# Altium integrated library Power IC.IntLib: 77 symbols
Pins are listed as number, name and electrical type; pins without a type are passive.

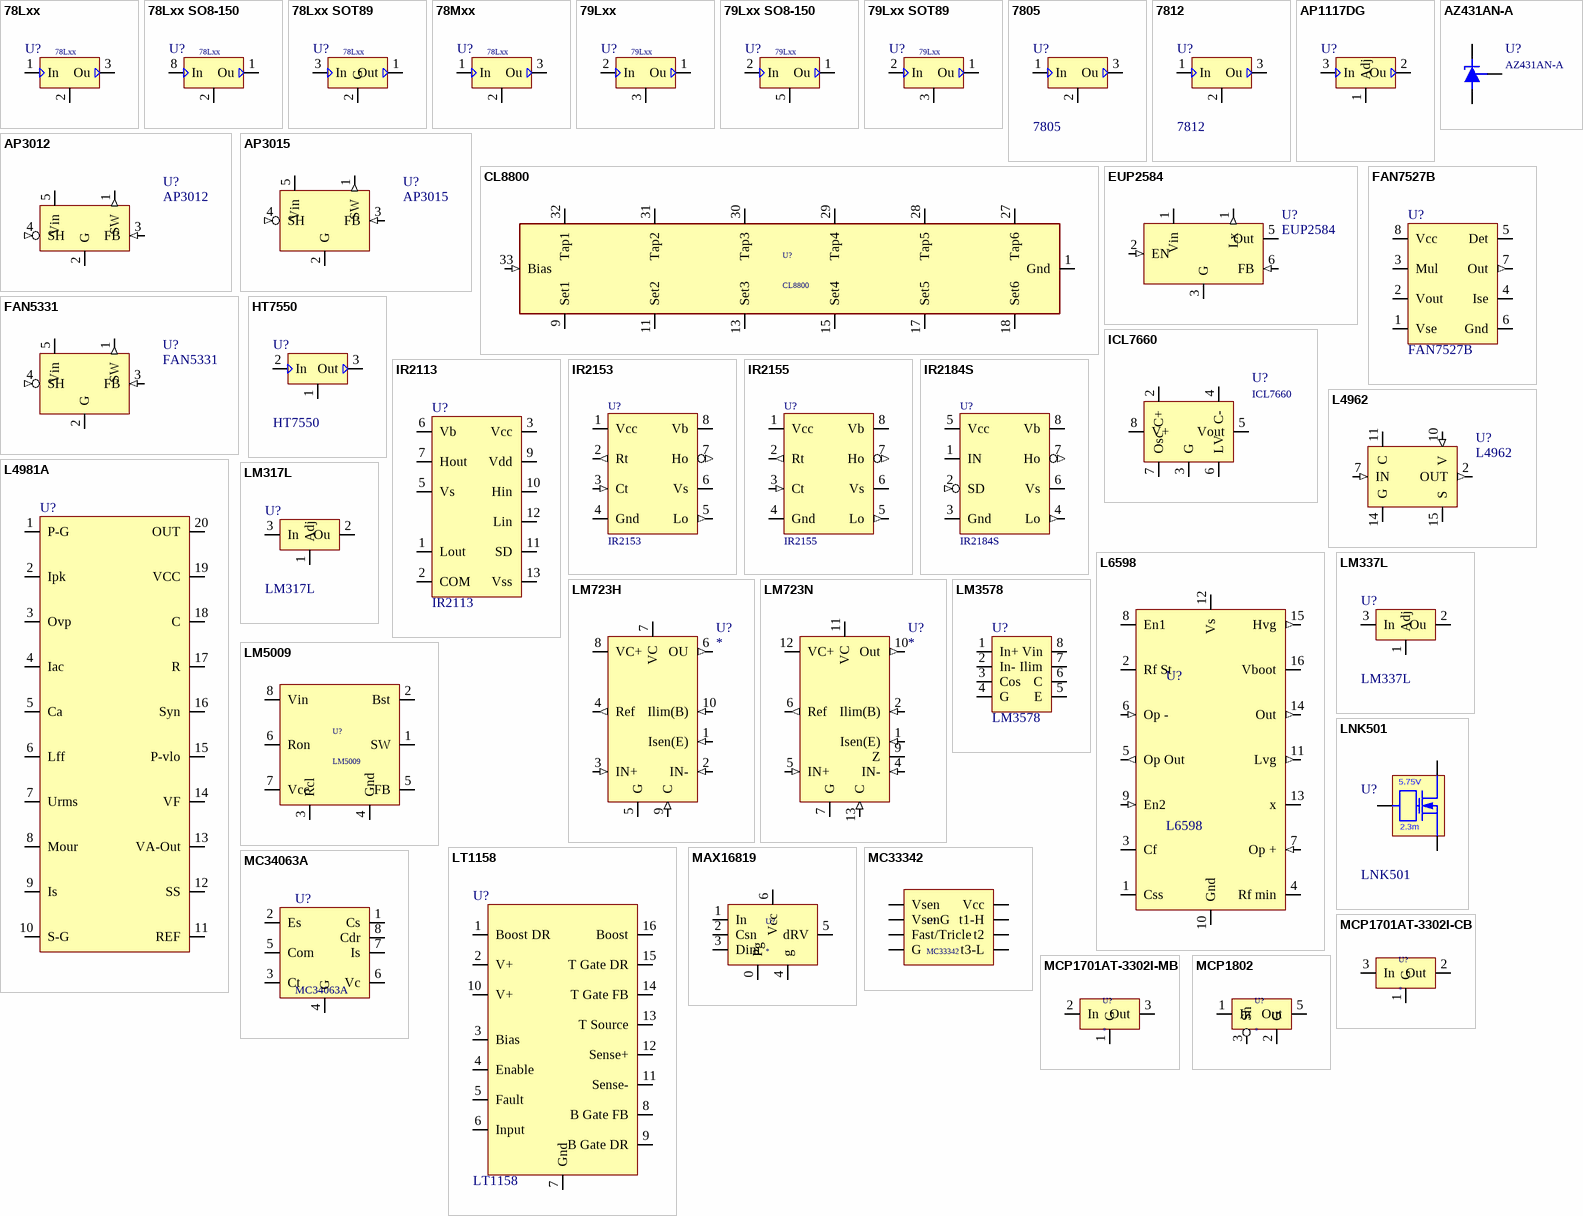
[diagram p0: symbols 78Lxx to MCP1802]

## 78Lxx
designator U?
0.1A d1.7V 3.6mA; Price: 0.184; Value: 78Lxx
footprint TO92C
footprint TO92A
footprint TO92
footprint TO92-1.27
pins: 1 In (power), 2 G (power), 3 Ou (power)

## 78Lxx SO8-150
designator U?, comment 78Lxx
0.1A d1.7V 3.6mA SO8-150; Price: 0.184; Value: 78Lxx
footprint SO8-150
pins: 1 Ou (power), 2 G (power), 3 G (power), 6 G (power), 7 G (power), 8 In (power)

## 78Lxx SOT89
designator U?, comment 78Lxx
0.1A d1.7V 3.6mA; Price: 0.184; Value: 78Lxx
footprint SOT89 (Footprint not found)
pins: 1 Out (power), 2 G (power), 3 In (power)

## 78Mxx
designator U?, comment 78Lxx
0.5A d1.7V 3.6mA; Price: 0.184; Value: 78Lxx
footprint TO220-1A 2.54
footprint TO220-2A 2.54
footprint TO220-2A 5.08
footprint TO220-1A 5.08
pins: 1 In (power), 2 G (power), 3 Ou (power)

## 79Lxx
designator U?
0.1A d1.7V 3.6mA; Price: 0.184; Value: 79Lxx
footprint TO92C
footprint TO92
footprint TO92A
footprint TO92-1.27
pins: 1 Ou (power), 2 In (power), 3 G (power)

## 79Lxx SO8-150
designator U?, comment 79Lxx
0.1A d1.7V 3.6mA SO8-150; Price: 0.184; Value: 79Lxx
footprint SO8-150
pins: 1 Ou (power), 2 In (power), 3 In (power), 5 G (power), 6 In (power), 7 In (power)

## 79Lxx SOT89
designator U?, comment 79Lxx
0.1A d1.7V 3.6mA; Price: 0.184; Value: 79Lxx
footprint SOT89 (SC-62)
pins: 1 Ou (power), 2 In (power), 3 G (power)

## 7805
designator U?
Price: 0.312
footprint TO220-1A 2.54
pins: 1 In (power), 2 G (power), 3 Ou (power)

## 7812
designator U?
Price: 0.312
footprint TO220-1A 2.54
pins: 1 In (power), 2 G (power), 3 Ou (power)

## AP1117DG
designator U?
1.25V  1A In-18V; Price: 0.11
footprint TO252AA
pins: 1 Adj, 2 Ou (power), 3 In (power)

## AP3012
designator U?
Vin-2.6-16V Vout-29V Fb-1.25V Imax-0.5A; Price: 0.82
footprint SOT23-5 (SOT23, 5-Leads, Body 2.9x1.3mm, Pitch 0.95mm, Lead Span 2.5mm)
pins: 1 SW (out), 2 G (power), 3 FB (in), 4 SH (in), 5 Vin (power)
1 alternate drawing of the same symbol

## AP3015
designator U?
Vin-1.2-12V Vout-38V Fb-1.23V Imax-0.35A; Price: 0.82
footprint SOT23-5 (SOT23, 5-Leads, Body 2.9x1.3mm, Pitch 0.95mm, Lead Span 2.5mm)
pins: 1 SW (out), 2 G (power), 3 FB (in), 4 SH (in), 5 Vin (power)
1 alternate drawing of the same symbol

## AZ431AN-A
designator U?
Price: 0.24
footprint SOT23
simulation model TL431A (subckt)
pins: 1 Adj, 2 K, 3 A

## CL8800
designator U?
footprint QFN-33
pins: 1 Gnd (power), 2 Gnd (power) hidden to Gnd, 3 Gnd (power) hidden to Gnd, 4 Gnd (power) hidden to Gnd, 5 Gnd (power) hidden to Gnd, 6 Gnd (power) hidden to Gnd, 7 Gnd (power) hidden to Gnd, 8 Gnd (power) hidden to Gnd, 9 Set1, 11 Set2, 13 Set3, 15 Set4, 17 Set5, 18 Set6, 19 Gnd (power) hidden to Gnd, 20 Gnd (power) hidden to Gnd, 21 Gnd (power) hidden to Gnd, 22 Gnd (power) hidden to Gnd, 23 Gnd (power) hidden to Gnd, 24 Gnd (power) hidden to Gnd, 25 Gnd (power) hidden to Gnd, 26 Gnd (power) hidden to Gnd, 27 Tap6 (oc), 28 Tap5 (oc), 29 Tap4 (oc), 30 Tap3 (oc), 31 Tap2 (oc), 32 Tap1 (oc), 33 Bias (in), 34 Gnd (power) hidden to Gnd

## EUP2584
designator U?
Led Driver  Vin 2.6-5.5V Vout 27V Fb-0.25V; Price: *
footprint SOT23-6 (SOT23, 6-Leads, Body 2.9x1.3mm, Pitch 0.95mm, Lead Span 2.5mm)
pins: 1 Lx (out), 1 Vin (power), 2 EN (in), 3 G (power), 5 Out, 6 FB (in)
1 alternate drawing of the same symbol

## FAN5331
designator U?
Led Driver  Vin-2.7-5.5V Vout-23V Fb-1.23V Imax-1A; Price: 0.82
footprint SOT23-5 (SOT23, 5-Leads, Body 2.9x1.3mm, Pitch 0.95mm, Lead Span 2.5mm)
pins: 1 SW (out), 2 G (power), 3 FB (in), 4 SH (in), 5 Vin (power)
1 alternate drawing of the same symbol

## FAN7527B
designator U?
Price: 1.08
footprint SO8-150
pins: 1 Vse, 2 Vout, 3 Mul, 4 Ise, 5 Det, 6 Gnd, 7 Out (out), 8 Vcc
1 alternate drawing of the same symbol

## HT7550
designator U?
In-24V Iss10uA dU0.1V; Price: 0.46
footprint SOT89 (SC-62)
pins: 1 G (power), 2 In (power), 3 Out (power)

## ICL7660
designator U?
Price: 1.26
footprint DIL8-300
pins: 2 C+, 3 G, 4 C-, 5 Vout, 6 LV, 7 Osc, 8 V+

## IR2113
designator U?
+2A/-2A 120&90nS 20nS; Price: 6.6
footprint DIL14-300
footprint SO14-150
pins: 1 Lout, 2 COM, 3 Vcc, 4 x hidden, 5 Vs, 6 Vb, 7 Hout, 8 (in) hidden to x, 9 Vdd, 10 Hin, 11 SD, 12 Lin, 13 Vss, 14 x (in) hidden

## IR2153
designator U?
Price: 1.5
footprint SO8-150
pins: 1 Vcc (power), 2 Rt (out), 3 Ct (in), 4 Gnd (power), 5 Lo (out), 6 Vs (power), 7 Ho (out), 8 Vb (power)

## IR2155
designator U?
Price: 4.452
footprint DIL8-300a
pins: 1 Vcc (power), 2 Rt (out), 3 Ct (in), 4 Gnd (power), 5 Lo (out), 6 Vs (power), 7 Ho (out), 8 Vb (power)

## IR2184S
designator U?
+1.4A/-1.8A 680&270nS 500nS; Price: 3.6
footprint SO8-150
pins: 1 IN, 2 SD (in), 3 Gnd (power), 4 Lo (out), 5 Vcc (power), 6 Vs, 7 Ho (out), 8 Vb

## L4962
designator U?
footprint DIL16-300a
pins: 2 OUT (out), 4 G (power) hidden to G, 5 G (power) hidden to GND, 7 IN (in), 10 V (in), 11 C (io), 12 G hidden to g, 13 G hidden to g, 14 G, 15 S

## L4981A
designator U?
Price: 10
footprint DIL20-300
pins: 1 P-G, 2 Ipk, 3 Ovp, 4 Iac, 5 Ca, 6 Lff, 7 Urms, 8 Mour, 9 Is, 10 S-G, 11 REF, 12 SS, 13 VA-Out, 14 VF, 15 P-vlo, 16 Syn, 17 R, 18 C, 19 VCC, 20 OUT

## L6598
designator U?
footprint DIL16-300a
pins: 1 Css, 2 Rf St, 3 Cf, 4 Rf min, 5 Op Out (out), 6 Op - (in), 7 Op + (in), 8 En1, 9 En2 (in), 10 Gnd (power), 11 Lvg (out), 12 Vs (power), 13 x, 14 Out (out), 15 Hvg (out), 16 Vboot

## LM317L
designator U?
1.25V  100mA In-40V; Price: 0.174
footprint TO92C
footprint TO92A
footprint TO92
footprint TO92-1.27
pins: 1 Adj, 2 Ou (power), 3 In (power)

## LM337L
designator U?
-1.25V  100mA In-40V; Price: 0.174
footprint TO92C
footprint TO92A
footprint TO92-1.27
footprint TO92
pins: 1 Adj, 2 Ou (power), 3 In (power)

## LM723H
designator U?
Price: 0.566
footprint TO10
pins: 1 Isen(E) (in), 2 IN- (in), 3 IN+ (in), 4 Ref (out), 5 G (power), 6 OU (out), 7 VC (power), 8 VC+ (power), 9 C (in), 10 Ilim(B) (in)

## LM723N
designator U?
Price: 0.566
footprint DIL14-300
pins: 1 Isen(E) (in), 2 Ilim(B) (in), 4 IN- (in), 5 IN+ (in), 6 Ref (out), 7 G (power), 9 Z, 10 Out (out), 11 VC (power), 12 VC+ (power), 13 C (in)

## LM3578
designator U?
footprint DIL8-300a
pins: 1 In+, 2 In-, 3 Cos, 4 G, 5 E, 6 C, 7 Ilim, 8 Vin

## LM5009
designator U?
Step-Down Vin 9.5-95V Iout 0.15A Fb 2.5V +/-2%; Price: 4.25
footprint VSOP8 (TSOP, 8-Leads, Body 3x3mm, Pitch 0.65mm, IPC High Density)
pins: 1 SW, 2 Bst, 3 Rcl, 4 Gnd, 5 FB, 6 Ron, 7 Vcc, 8 Vin

## LNK501
designator U?
42kHz 77% 254mA Contr 2.3mA-5.75V; Price: 1.52
footprint DIL8-300 LNK TNY26x
pins: 1 S, 2 S, 3 S, 4 S, 5 D, 7 S, 8 Con    
text: 5.75V; 2.3m

## LT1158
designator U?
Price: 8.2
footprint DIL16-300a
pins: 1 Boost DR (power), 2 V+, 3 Bias (power), 4 Enable (power), 5 Fault (power), 6 Input (power), 7 Gnd (power), 8 B Gate FB (power), 9 B Gate DR (power), 10 V+ (power), 11 Sense- (power), 12 Sense+ (power), 13 T Source (power), 14 T Gate FB (power), 15 T Gate DR (power), 16 Boost (power)

## MAX16819
designator U?
footprint TDFN-EP 6 (3x3x0.8 6Pin)
pins: 0 Pg, 1 In, 2 Csn, 3 Dim, 4 g, 5 dRV, 6 Vcc

## MC33342
designator U?
footprint SO8-150 (Footprint not found)
pins: 1 Vsen, 2 VsenG (oc), 3 Fast/Tricle (oc), 4 G (power), 5 t3-L, 6 t2, 7 t1-H, 8 Vcc (power)

## MC34063A
designator U?
Price: 0.54
footprint DIL8-300a
pins: 1 Cs, 2 Es, 3 Ct, 4 G, 5 Com, 6 Vc, 7 Is, 8 Cdr
3 alternate drawings of the same symbol

## MCP1701AT-3302I-CB
designator U?
3.3V /0.15A 12Vmax 0.7V/150mA 4.5uA; Price: 1.53
footprint SOT23-5
pins: 1 G, 2 Out, 3 In, 4 NC hidden to x

## MCP1701AT-3302I-MB
designator U?
3.3V /0.15A 12Vmax 0.7V/150mA 4.5uA; Price: 1.53
footprint SOT89 (SC-62)
pins: 1 G, 2 In, 3 Out, 4 NC hidden to x

## MCP1802
designator U?
5V /0.A 10Vmax 0.2V/100mA 25uA/0.01uA Sh; Price: 1.53
footprint SOT23-5
pins: 1 In, 2 G, 3 Sh, 4 NC hidden to x, 5 Out

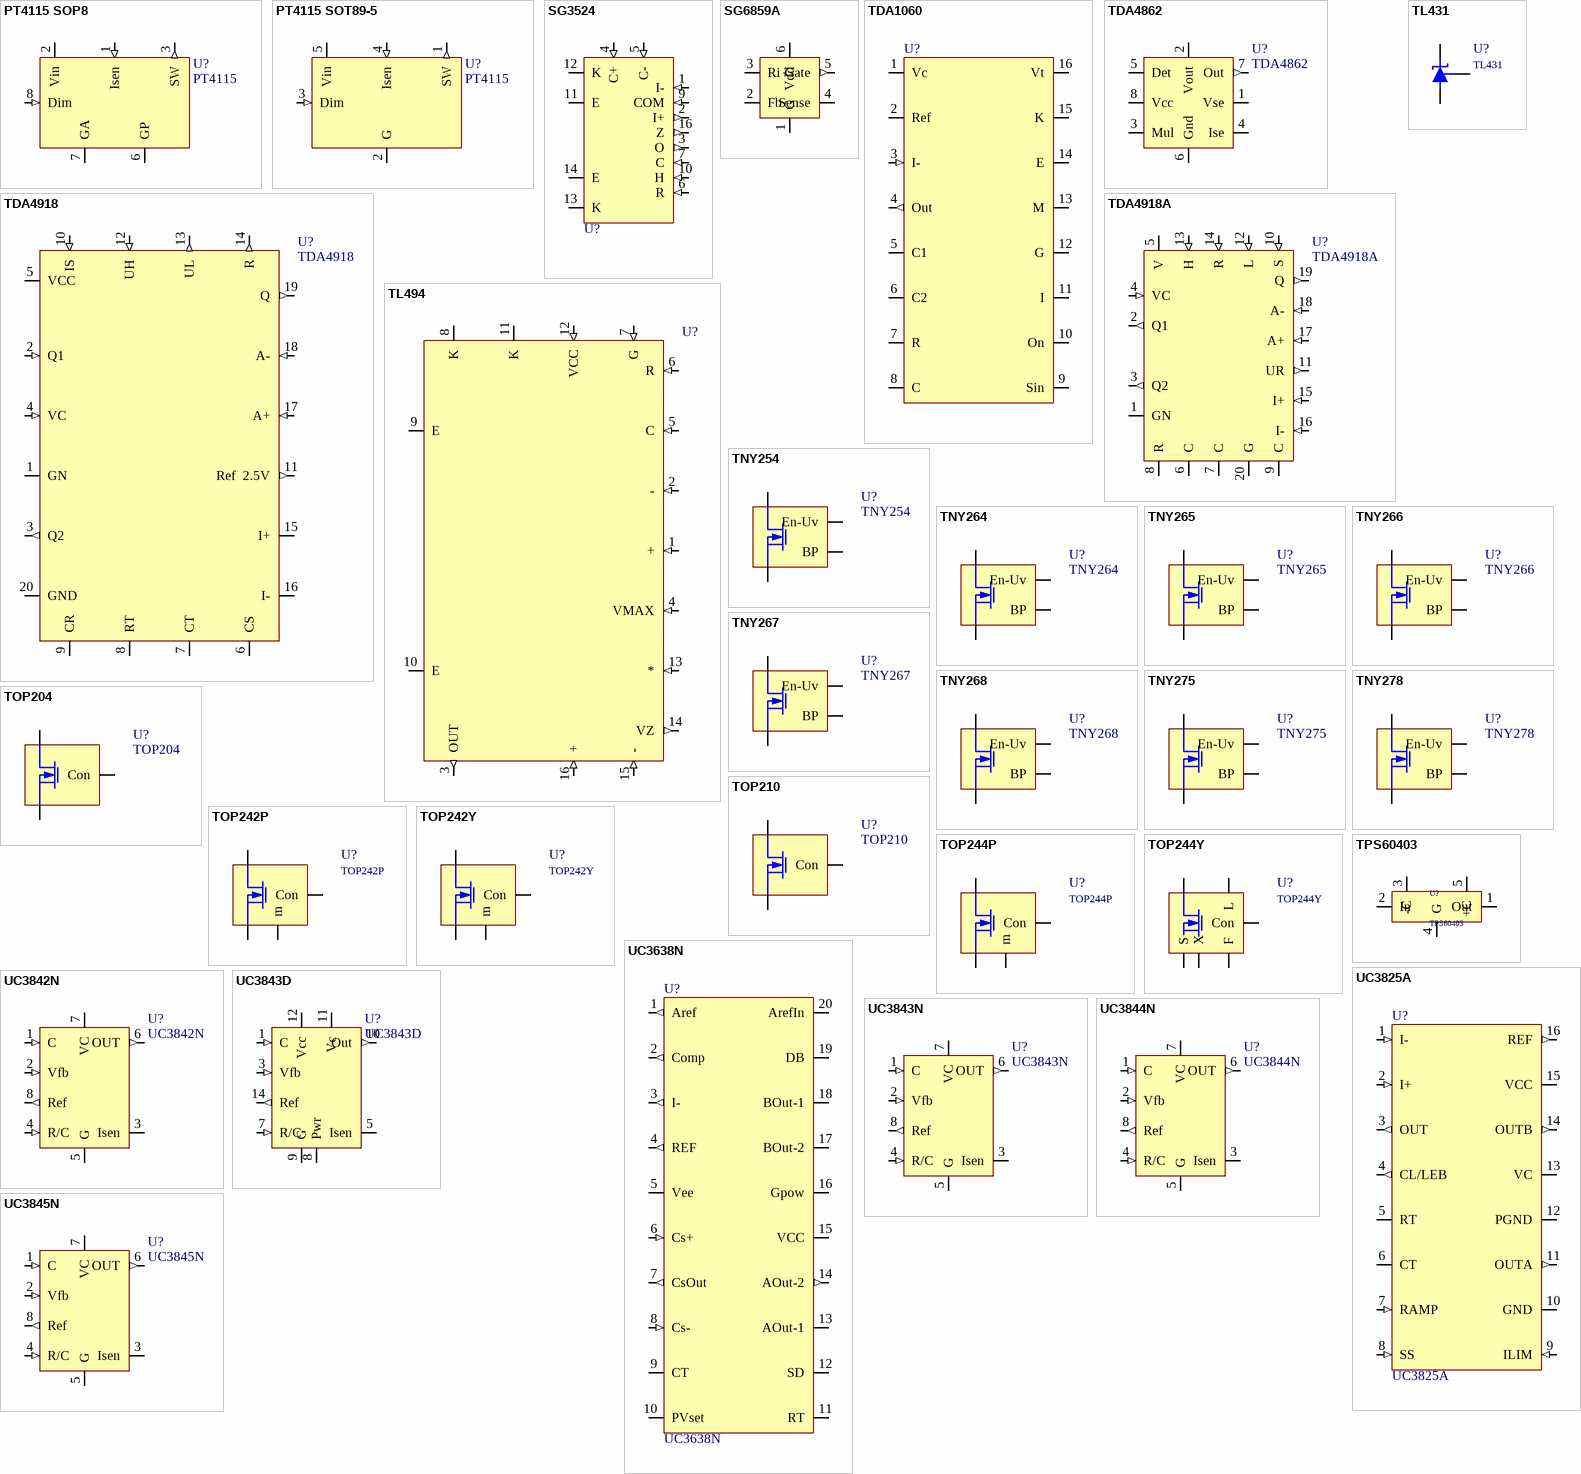
[diagram p1: symbols PT4115 SOP8 to UC3845N]

## PT4115 SOP8
designator U?, comment PT4115
Led Driver  1.2A 6-30V SOP8; Price: *
footprint SO8-150
pins: 1 Isen (in), 2 Vin (power), 3 SW (out), 6 GP (power), 7 GA (power), 8 Dim (in)

## PT4115 SOT89-5
designator U?, comment PT4115
Led Driver  1.2A 6-30V SOT89-5; Price: *
footprint SOT89-5 (SC-62)
pins: 1 SW (out), 2 G (power), 3 Dim (in), 4 Isen (in), 5 Vin (power)

## SG3524
designator U?
footprint DIL16-300a
pins: 1 I- (in), 2 I+ (out), 3 O (out), 4 C+ (in), 5 C- (in), 6 R (in), 7 C (in), 8 GND (power) hidden to GND, 9 COM (in), 10 H (in), 11 E (oe), 12 K (oc), 13 K (oc), 14 E (oe), 15 VCC (power) hidden to VCC, 16 Z (out)

## SG6859A
designator *
footprint SOT23-6
pins: 1 G (power), 2 Fb, 3 Ri, 4 Sense, 5 Gate (out), 6 Vdd (power)

## TDA1060
designator U?
Price: 3
footprint DIL16-300
pins: 1 Vc, 2 Ref, 3 I- (in), 4 Out (out), 5 C1, 6 C2, 7 R, 8 C, 9 Sin, 10 On, 11 I, 12 G, 13 M, 14 E (oe), 15 K (oc), 16 Vt

## TDA4862
designator U?
Price: 1.08
footprint DIL8-300a
pins: 1 Vse, 2 Vout, 3 Mul, 4 Ise, 5 Det, 6 Gnd, 7 Out (out), 8 Vcc

## TDA4918
designator U?
footprint DIL20-300
pins: 1 GN, 2 Q1 (in), 3 Q2 (out), 4 VC (in), 5 VCC (power), 6 CS, 7 CT, 8 RT, 9 CR, 10 IS (in), 11 Ref  2.5V (out), 12 UH (in), 13 UL (out), 14 R (out), 15 I+, 16 I-, 17 A+ (in), 18 A- (in), 19 Q (out), 20 GND (power)

## TDA4918A
designator U?
footprint DIL20-300
pins: 1 GN, 2 Q1 (out), 3 Q2 (out), 4 VC (in), 5 V, 6 C, 7 C, 8 R, 9 C, 10 S (in), 11 UR (out), 12 L (in), 13 H (in), 14 R (in), 15 I+ (in), 16 I- (in), 17 A+ (in), 18 A- (in), 19 Q (out), 20 G

## TL431
designator U?
Price: 0.24
footprint TO92C
simulation model TL431 (Subckt)
footprint TO92
footprint TO92-1.27
pins: 1 K, 2 A, 3 Adj

## TL494
designator U?
Price: 0.42
footprint DIL16-300A
pins: 1 + (in), 2 - (in), 3 OUT (out), 4 VMAX (in), 5 C (in), 6 R (in), 7 G (in), 8 K (oc), 9 E (oe), 10 E (oe), 11 K (oc), 12 VCC (in), 13 * (in), 14 VZ (out), 15 - (in), 16 + (in)
1 alternate drawing of the same symbol

## TNY254
designator U?
4W 0.255A 44kHz; Price: 1.52
footprint DIL8-300a
pins: 1 BP, 2 S, 3 S, 4 En-Uv, 5 D, 6 S, 7 S, 8 S

## TNY264
designator U?
9W 0.25A 132kHz; Price: 1.52
footprint DIL8-300 LNK TNY26x
pins: 1 BP, 2 S, 3 S, 4 En-Uv, 5 D, 7 S, 8 S

## TNY265
designator U?
11W 0.275A 132kHz; Price: 1.52
footprint DIL8-300 LNK TNY26x
pins: 1 BP, 2 S, 3 S, 4 En-Uv, 5 D, 7 S, 8 S

## TNY266
designator U?
15W 0.35A 132kHz; Price: 1.52
footprint DIL8-300 LNK TNY26x
pins: 1 BP, 2 S, 3 S, 4 En-Uv, 5 D, 7 S, 8 S

## TNY267
designator U?
19W 0.45A 132kHz; Price: 1.52
footprint DIL8-300 LNK TNY26x
pins: 1 BP, 2 S, 3 S, 4 En-Uv, 5 D, 7 S, 8 S

## TNY268
designator U?
23W 0.55A 132kHz; Price: 1.52
footprint DIL8-300 LNK TNY26x
pins: 1 BP, 2 S, 3 S, 4 En-Uv, 5 D, 7 S, 8 S

## TNY275
designator U?
15W 0.275A 132kHz; Price: 1.61
footprint DIL8-300 TNY27x
pins: 1 En-Uv, 2 BP, 4 D, 5 S, 6 S, 7 S, 8 S

## TNY278
designator U?
28W 0.55A 132kHz; Price: 2.16
footprint DIL8-300 TNY27x
pins: 1 En-Uv, 2 BP, 4 D, 5 S, 6 S, 7 S, 8 S

## TOP204
designator U?
60-100W 2.25A 100KHz; Price: 6
footprint TO220-1A 5.08
footprint TO220-1A 2.54
pins: 1 Con, 2 S, 3 D

## TOP210
designator U?
8W 0.25A 100kHz; Price: 5.35
footprint DIL8-300a
pins: 1 S, 4 Con, 5 D, 8 S-HV

## TOP242P
designator U?
10W 0.45A 132KHz; Price: 6
footprint DIL8-300 LNK TNY26x
pins: 1 m, 2 S, 3 S, 4 Con, 5 D, 7 S, 8 S

## TOP242Y
designator U?
10W 0.45A 132KHz; Price: 6
footprint TO220-7C (Footprint not found)
pins: 1 m, 2 S, 3 S, 4 Con, 5 D, 7 S

## TOP244P
designator U?
28W 1A 132kHz; Price: 4.5
footprint DIL8-300 LNK TNY26x
pins: 1 m, 2 S, 3 S, 4 Con, 5 D, 7 S, 8 S

## TOP244Y
designator U?
45W 1.35A 132kHz; Price: 6
footprint TO220-7C
pins: 1 Con, 2 L, 3 X, 4 S, 5 F, 7 D

## TPS60403
designator U?
In 1.8-5.5V 60mA 250kHz; Price: 1.8
footprint SOT23-5
pins: 1 Out, 2 In, 3 -C, 4 G, 5 +C

## UC3638N
designator U?
Price: 11.76
footprint DIL20-300
pins: 1 Aref (out), 2 Comp (out), 3 I- (out), 4 REF (out), 5 Vee (power), 6 Cs+ (in), 7 CsOut (out), 8 Cs- (in), 9 CT, 10 PVset, 11 RT, 12 SD, 13 AOut-1 (oc), 14 AOut-2 (out), 15 VCC (power), 16 Gpow (power), 17 BOut-2 (power), 18 BOut-1 (power), 19 DB (power), 20 ArefIn (power)

## UC3825A
designator U?
Price: 6.97
footprint DIL16-300a
pins: 1 I- (in), 2 I+ (in), 3 OUT (out), 4 CL/LEB (out), 5 RT, 6 CT, 7 RAMP (in), 8 SS (in), 9 ILIM (in), 10 GND, 11 OUTA (out), 12 PGND, 13 VC, 14 OUTB (out), 15 VCC, 16 REF (out)
1 alternate drawing of the same symbol

## UC3842N
designator U?
10-16V 100%; Price: 0.66
footprint DIL8-300a
pins: 1 C (in), 2 Vfb (in), 3 Isen, 4 R/C (in), 5 G, 6 OUT (out), 7 VC, 8 Ref (out)

## UC3843D
designator U?
7.9-8.5V 100%; Price: 0.66
footprint SO14-150
pins: 1 C (in), 3 Vfb (in), 5 Isen, 7 R/C (in), 8 Pwr, 9 G, 10 Out (out), 11 Vc, 12 Vcc, 14 Ref (out)

## UC3843N
designator U?
7.9-8.5V 100%; Price: 0.66
footprint DIL8-300a
footprint SO14-150
pins: 1 C (in), 2 Vfb (in), 3 Isen, 4 R/C (in), 5 G, 6 OUT (out), 7 VC, 8 Ref (out)

## UC3844N
designator U?
10-16V 50%; Price: 0.66
footprint DIL8-300a
footprint SO8-150
pins: 1 C (in), 2 Vfb (in), 3 Isen, 4 R/C (in), 5 G, 6 OUT (out), 7 VC, 8 Ref (out)

## UC3845N
designator U?
7.9-8.5V 50%; Price: 0.66
footprint DIL8-300a
pins: 1 C (in), 2 Vfb (in), 3 Isen, 4 R/C (in), 5 G, 6 OUT (out), 7 VC, 8 Ref (out)

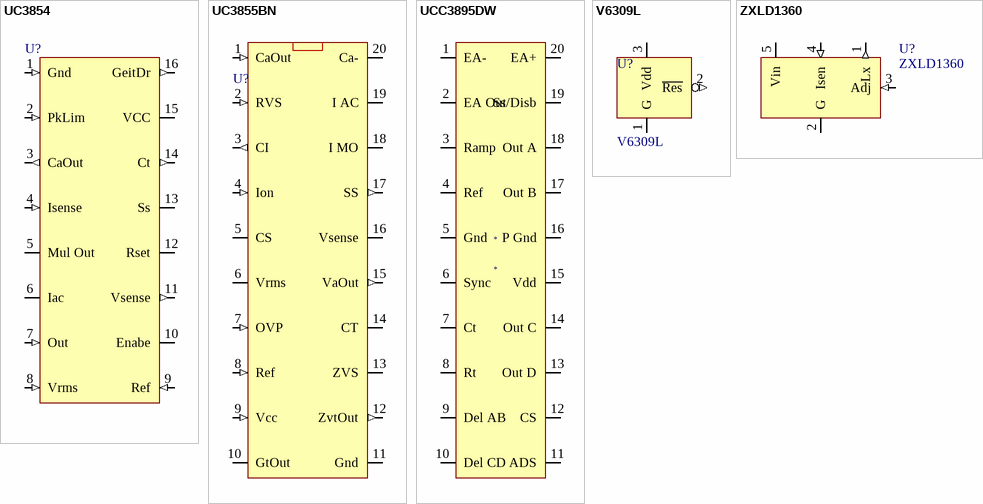
[diagram p2: symbols UC3854 to ZXLD1360]

## UC3854
designator U?
Price: 14.48
footprint DIL16-300a
pins: 1 Gnd (in), 2 PkLim (in), 3 CaOut (out), 4 Isense (in), 5 Mul Out, 6 Iac, 7 Out (in), 8 Vrms (in), 9 Ref (in), 10 Enabe, 11 Vsense (out), 12 Rset, 13 Ss, 14 Ct (out), 15 VCC, 16 GeitDr (out)

## UC3855BN
designator U?
PFC 500kHz 10.5/10V; Price: 32.34
footprint DIL20-300
pins: 1 CaOut (in), 2 RVS (in), 3 CI (out), 4 Ion (in), 5 CS, 6 Vrms, 7 OVP (in), 8 Ref (in), 9 Vcc (in), 10 GtOut, 11 Gnd, 12 ZvtOut (out), 13 ZVS, 14 CT, 15 VaOut (out), 16 Vsense, 17 SS (out), 18 I MO, 19 I AC, 20 Ca-

## UCC3895DW
designator *
Price: 24.6
pins: 1 EA-, 2 EA Out, 3 Ramp, 4 Ref, 5 Gnd, 6 Sync, 7 Ct, 8 Rt, 9 Del AB, 10 Del CD, 11 ADS, 12 CS, 13 Out D, 14 Out C, 15 Vdd, 16 P Gnd, 17 Out B, 18 Out A, 19 Ss/Disb, 20 EA+

## V6309L
designator U?
Reset 4.63V push-pul U < Lov 60uA; Price: 0.174
footprint SOT23
pins: 1 G (power), 2 ~{Res} (out), 3 Vdd (power)

## ZXLD1360
designator U?
Led Driver  1A 7-30V; Price: *
footprint SOT23-5 (Footprint not found)
pins: 1 Lx (out), 2 G (power), 3 Adj (in), 4 Isen (in), 5 Vin (power)
1 alternate drawing of the same symbol